# Altium footprint library ERNI THD.PcbLib: 27 footprints (part 3 of 3)
Each footprint in its own frame and in the unit in brackets; x right, y up, seen from the top. Pads: shape width x height; smd on the part's side, far side on the other; paste and mask are expansions set on the pad; w line width, h text height; cw(c..) or ccw(c..) is an arc to the next point about the centre after c.
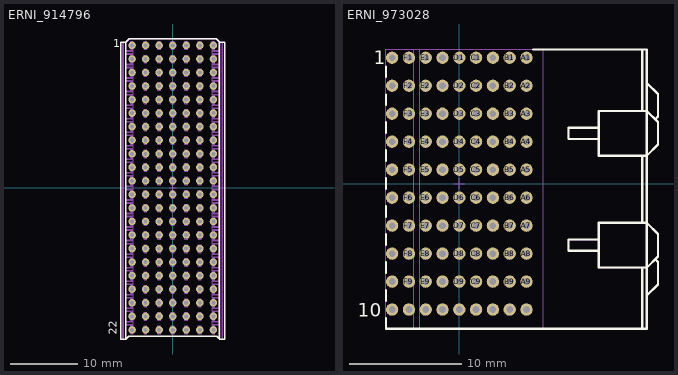
[diagram p2: the footprints below, top view; thin cyan lines are the x and y axes]

## ERNI_914796 [mm] "Type B22, 110 Signal Contacts in 5 Rows + 44 Ground Shield in 2 Rows, (154 Contacts in 7 Rows z,a,b,c,d,e,f of 22 positions), Pitch 2 mm,  Press-Fit, Vertical Ermet Hard Metric Male Connector"
height 13.45
pads (154):
  round 1.1 hole 0.6: A1(-4,21) A2(-4,19) A3(-4,17) A4(-4,15) A5(-4,13) A6(-4,11) A7(-4,9) A8(-4,7) A9(-4,5) A10(-4,3) A11(-4,1) A12(-4,-1) A13(-4,-3) A14(-4,-5) A15(-4,-7) A16(-4,-9) A17(-4,-11) A18(-4,-13) A19(-4,-15) A20(-4,-17) A21(-4,-19) A22(-4,-21) B1(-2,21) B2(-2,19) B3(-2,17) B4(-2,15) B5(-2,13) B6(-2,11) B7(-2,9) B8(-2,7) B9(-2,5) B10(-2,3) B11(-2,1) B12(-2,-1) B13(-2,-3) B14(-2,-5) B15(-2,-7) B16(-2,-9) B17(-2,-11) B18(-2,-13) B19(-2,-15) B20(-2,-17) B21(-2,-19) B22(-2,-21) C1(0,21) C2(0,19) C3(0,17) C4(0,15) C5(0,13) C6(0,11) C7(0,9) C8(0,7) C9(0,5) C10(0,3) C11(0,1) C12(0,-1) C13(0,-3) C14(0,-5) C15(0,-7) C16(0,-9) C17(0,-11) C18(0,-13) C19(0,-15) C20(0,-17) C21(0,-19) C22(0,-21) D1(2,21) D2(2,19) D3(2,17) D4(2,15) D5(2,13) D6(2,11) D7(2,9) D8(2,7) D9(2,5) D10(2,3) D11(2,1) D12(2,-1) D13(2,-3) D14(2,-5) D15(2,-7) D16(2,-9) D17(2,-11) D18(2,-13) D19(2,-15) D20(2,-17) D21(2,-19) D22(2,-21) E1(4,21) E2(4,19) E3(4,17) E4(4,15) E5(4,13) E6(4,11) E7(4,9) E8(4,7) E9(4,5) E10(4,3) E11(4,1) E12(4,-1) E13(4,-3) E14(4,-5) E15(4,-7) E16(4,-9) E17(4,-11) E18(4,-13) E19(4,-15) E20(4,-17) E21(4,-19) E22(4,-21) F1(6,21) F2(6,19) F3(6,17) F4(6,15) F5(6,13) F6(6,11) F7(6,9) F8(6,7) F9(6,5) F10(6,3) F11(6,1) F12(6,-1) F13(6,-3) F14(6,-5) F15(6,-7) F16(6,-9) F17(6,-11) F18(6,-13) F19(6,-15) F20(6,-17) F21(6,-19) F22(6,-21) Z1(-6,21) Z2(-6,19) Z3(-6,17) Z4(-6,15) Z5(-6,13) Z6(-6,11) Z7(-6,9) Z8(-6,7) Z9(-6,5) Z10(-6,3) Z11(-6,1) Z12(-6,-1) Z13(-6,-3) Z14(-6,-5) Z15(-6,-7) Z16(-6,-9) Z17(-6,-11) Z18(-6,-13) Z19(-6,-15) Z20(-6,-17) Z21(-6,-19) Z22(-6,-21)
Top Overlay:
  lines w0.2: -6.9,21.5 -6.9,-22.35 ; 6.8,-22.25 6.5,-21.95 -6.5,-21.95 -6.9,-22.35 ; 6.9,21.5 6.9,-22.35 7.7,-22.35 7.7,21.45 ; 7.7,0 7.7,21.45 ; -6.9,-22.35 -7.7,-22.35 -7.7,21.45 -6.95,21.45 -6.45,21.95 6.45,21.95 6.95,21.45 7.7,21.45
  text "22" at -8.25,-21.725 h1.2
  text "1" at -8.8,20.7 h1.2
Mechanical 8:
  lines w0.1: -6.5,-21 -6,-21 ; -6.5,-19 -6,-19 ; -6.5,19 -6,19 ; -6.5,21 -6,21 ; -6,-21.5 -6,-21 ; -6,-20.5 -6,-21 ; -6,-19.5 -6,-19 ; -6,-18.5 -6,-19 ; -6,18.5 -6,19 ; -6,19.5 -6,19 ; -6,20.5 -6,21 ; -6,21.5 -6,21 ; -5.5,-21 -6,-21 ; -5.5,-19 -6,-19 ; -5.5,19 -6,19 ; -5.5,21 -6,21 ; -4.5,-21 -4,-21 ; -4.5,-19 -4,-19 ; -4.5,19 -4,19 ; -4.5,21 -4,21 ; -4,-21.5 -4,-21 ; -4,-20.5 -4,-21 ; -4,-19.5 -4,-19 ; -4,-18.5 -4,-19 ; -4,18.5 -4,19 ; -4,19.5 -4,19 ; -4,20.5 -4,21 ; -4,21.5 -4,21 ; -3.5,-21 -4,-21 ; -3.5,-19 -4,-19 ; -3.5,19 -4,19 ; -3.5,21 -4,21 ; -2.5,-21 -2,-21 ; -2.5,-19 -2,-19 ; -2.5,19 -2,19 ; -2.5,21 -2,21 ; -2,-21.5 -2,-21 ; -2,-20.5 -2,-21 ; -2,-19.5 -2,-19 ; -2,-18.5 -2,-19 ; -2,18.5 -2,19 ; -2,19.5 -2,19 ; -2,20.5 -2,21 ; -2,21.5 -2,21 ; -1.5,-21 -2,-21 ; -1.5,-19 -2,-19 ; -1.5,19 -2,19 ; -1.5,21 -2,21 ; -0.5,-21 0,-21 ; -0.5,-19 0,-19 ; -0.5,-3 0,-3 ; -0.5,0 0,0 ; -0.5,19 0,19 ; -0.5,21 0,21 ; 0,-21.5 0,-21 ; 0,-20.5 0,-21 ; 0,-19.5 0,-19 ; 0,-18.5 0,-19 ; 0,-3.5 0,-3 ; 0,-2.5 0,-3 ; 0,-0.5 0,0 ; 0,0.5 0,0 ; 0,18.5 0,19 ; 0,19.5 0,19 ; 0,20.5 0,21 ; 0,21.5 0,21 ; 0.5,-21 0,-21 ; 0.5,-19 0,-19 ; 0.5,-3 0,-3 ; 0.5,0 0,0 ; 0.5,19 0,19 ; 0.5,21 0,21 ; 1.5,-21 2,-21 ; 1.5,-19 2,-19 ; 1.5,19 2,19 ; 1.5,21 2,21 ; 2,-21.5 2,-21 ; 2,-20.5 2,-21 ; 2,-19.5 2,-19 ; 2,-18.5 2,-19 ; 2,18.5 2,19 ; 2,19.5 2,19 ; 2,20.5 2,21 ; 2,21.5 2,21 ; 2.5,-21 2,-21 ; 2.5,-19 2,-19 ; 2.5,19 2,19 ; 2.5,21 2,21 ; 3.5,-21 4,-21 ; 3.5,-19 4,-19 ; 3.5,19 4,19 ; 3.5,21 4,21 ; 4,-21.5 4,-21 ; 4,-20.5 4,-21 ; 4,-19.5 4,-19 ; 4,-18.5 4,-19 ; 4,18.5 4,19 ; 4,19.5 4,19 ; 4,20.5 4,21 ; 4,21.5 4,21 ; 4.5,-21 4,-21 ; 4.5,-19 4,-19 ; 4.5,19 4,19 ; 4.5,21 4,21 ; 5.5,-21 6,-21 ; 5.5,-19 6,-19 ; 5.5,19 6,19 ; 5.5,21 6,21 ; 6,-21.5 6,-21 ; 6,-20.5 6,-21 ; 6,-19.5 6,-19 ; 6,-18.5 6,-19 ; 6,18.5 6,19 ; 6,19.5 6,19 ; 6,20.5 6,21 ; 6,21.5 6,21 ; 6.5,-21 6,-21 ; 6.5,-19 6,-19 ; 6.5,19 6,19 ; 6.5,21 6,21
Mechanical 14:
  drawing of 901 lines, arcs and shapes, not listed
  text "22" at -8.25,-21.725 h1.2
  text "a" at -4.5,22.425 h1.2
  text "z" at -6.525,22.45 h1.2
  text "b" at -2.527,22.345 h1.2
  text "c" at -0.479,22.345 h1.2
  text "d" at 1.552,22.345 h1.2
  text "e" at 3.525,22.37 h1.2
  text "f" at 5.521,22.327 h1.2
  text "1" at -8.8,20.7 h1.2
Drill Drawing:
  lines w0.1: -6.9,-21.95 -6.9,21.95 6.9,21.95 6.9,-21.95 -6.9,-21.95
  text "PRESS-FIT TECHNOLOGY diam. 0.6mm +/-0.05" at 8.25,-18.9 h1
3D body "ERNI_914796.stp": height 13.45, standoff -3.7, extent -7.7,-22.35 7.7,21.95

## ERNI_973028 [mm] "90 Contacts (10x3 Pairs Signal Contacts + 3x10 Ground Contacts), Pitch 2.5mm, Press-Fit, Right Angle Ermet ZD High Speed Differential Hard Metric Female Connector"
height 16.9
pads (90):
  round 1.1 hole 0.6: A1(6,11.25) A2(6,8.75) A3(6,6.25) A4(6,3.75) A5(6,1.25) A6(6,-1.25) A7(6,-3.75) A8(6,-6.25) A9(6,-8.75) A10(6,-11.25) AB1(3,11.25) AB2(3,8.75) AB3(3,6.25) AB4(3,3.75) AB5(3,1.25) AB6(3,-1.25) AB7(3,-3.75) AB8(3,-6.25) AB9(3,-8.75) AB10(3,-11.25) B1(4.5,11.25) B2(4.5,8.75) B3(4.5,6.25) B4(4.5,3.75) B5(4.5,1.25) B6(4.5,-1.25) B7(4.5,-3.75) B8(4.5,-6.25) B9(4.5,-8.75) B10(4.5,-11.25) C1(1.5,11.25) C2(1.5,8.75) C3(1.5,6.25) C4(1.5,3.75) C5(1.5,1.25) C6(1.5,-1.25) C7(1.5,-3.75) C8(1.5,-6.25) C9(1.5,-8.75) C10(1.5,-11.25) CD1(-1.5,11.25) CD2(-1.5,8.75) CD3(-1.5,6.25) CD4(-1.5,3.75) CD5(-1.5,1.25) CD6(-1.5,-1.25) CD7(-1.5,-3.75) CD8(-1.5,-6.25) CD9(-1.5,-8.75) CD10(-1.5,-11.25) D1(0,11.25) D2(0,8.75) D3(0,6.25) D4(0,3.75) D5(0,1.25) D6(0,-1.25) D7(0,-3.75) D8(0,-6.25) D9(0,-8.75) D10(0,-11.25) E1(-3,11.25) E2(-3,8.75) E3(-3,6.25) E4(-3,3.75) E5(-3,1.25) E6(-3,-1.25) E7(-3,-3.75) E8(-3,-6.25) E9(-3,-8.75) E10(-3,-11.25) EF1(-6,11.25) EF2(-6,8.75) EF3(-6,6.25) EF4(-6,3.75) EF5(-6,1.25) EF6(-6,-1.25) EF7(-6,-3.75) EF8(-6,-6.25) EF9(-6,-8.75) EF10(-6,-11.25) F1(-4.5,11.25) F2(-4.5,8.75) F3(-4.5,6.25) F4(-4.5,3.75) F5(-4.5,1.25) F6(-4.5,-1.25) F7(-4.5,-3.75) F8(-4.5,-6.25) F9(-4.5,-8.75) F10(-4.5,-11.25)
Top Overlay:
  lines w0.2: -6.55,-12.025 -6.55,-12.955 16.75,-12.955 16.75,11.995 6.589,11.995 ; -6.55,-10.475 -6.55,-9.525 ; -6.55,-7.975 -6.55,-7.025 ; -6.55,-5.475 -6.55,-4.525 ; -6.55,-2.975 -6.55,-2.025 ; -6.55,-0.475 -6.55,0.475 ; -6.55,2.025 -6.55,2.975 ; -6.55,4.525 -6.55,5.475 ; -6.55,7.025 -6.55,7.975 ; -6.55,9.525 -6.55,10.475 ; 12.45,-6 9.75,-6 9.75,-5 12.45,-5 ; 12.45,4 9.75,4 9.75,5 12.45,5 ; 16.35,6.5 16.35,11.995 ; 16.351,-12.955 16.351,-7.5 ; 16.351,-3.5 16.351,2.5 ; 16.75,-10 17.75,-9 17.75,-7 17.5,-6.75 ; 16.75,9 17.75,8 17.75,6 17.5,5.75 ; 12.45,-7.5 16.75,-7.5 17.75,-6.5 17.75,-4.5 16.75,-3.5 12.45,-3.5 12.45,-7.5 ; 12.45,2.5 16.75,2.5 17.75,3.5 17.75,5.5 16.75,6.5 12.45,6.5 12.45,2.5
  text "10" at -9.05,-11.875 h1.2
  text "1" at -7.65,10.675 h1.2
Mechanical 8:
  drawing of 366 lines, arcs and shapes, not listed
  text "PCB EDGE" at 9.23,-4.975 h1.2
Mechanical 14:
  lines w0.1: -4.05,-12.955 -4.05,11.995 ; -3.55,-12.955 -3.55,11.995 ; 12.45,-6 9.75,-6 9.75,-5 12.45,-5 ; 12.45,4 9.75,4 9.75,5 12.45,5 ; 16.35,6.5 16.35,11.995 ; 16.351,-12.955 16.351,-7.5 ; 16.351,-3.5 16.351,2.5 ; 16.75,-10 17.75,-9 17.75,-7 17.5,-6.75 ; 16.75,9 17.75,8 17.75,6 17.5,5.75 ; -6.55,-12.955 16.75,-12.955 16.75,11.995 -6.55,11.995 -6.55,-12.955 ; 12.45,-7.5 16.75,-7.5 17.75,-6.5 17.75,-4.5 16.75,-3.5 12.45,-3.5 12.45,-7.5 ; 12.45,2.5 16.75,2.5 17.75,3.5 17.75,5.5 16.75,6.5 12.45,6.5 12.45,2.5
  text "10" at -9.05,-11.875 h1.2
  text "1" at -7.65,10.675 h1.2
Drill Drawing:
  lines w0.1: -6.55,-12.005 -6.55,11.995 ; -6.55,-12 6.815,-12 6.815,12 -6.55,12
  text "diam. 0.6mm +/-0.05" at 9.875,-8.35 h1
  text "PRESS-FIT TECHNOLOGY" at 8.265,-8.75 h1
3D body "ERNI_973028.stp": height 12.2, standoff -4.7, extent -6.55,-12.955 17.75,11.995